# Altium footprint library My Library.PcbLib: 872 footprints (part 3 of 55)
Each footprint in its own frame and in the unit in brackets; x right, y up, seen from the top. Pads: shape width x height; smd on the part's side, far side on the other; paste and mask are expansions set on the pad; w line width, h text height; cw(c..) or ccw(c..) is an arc to the next point about the centre after c.
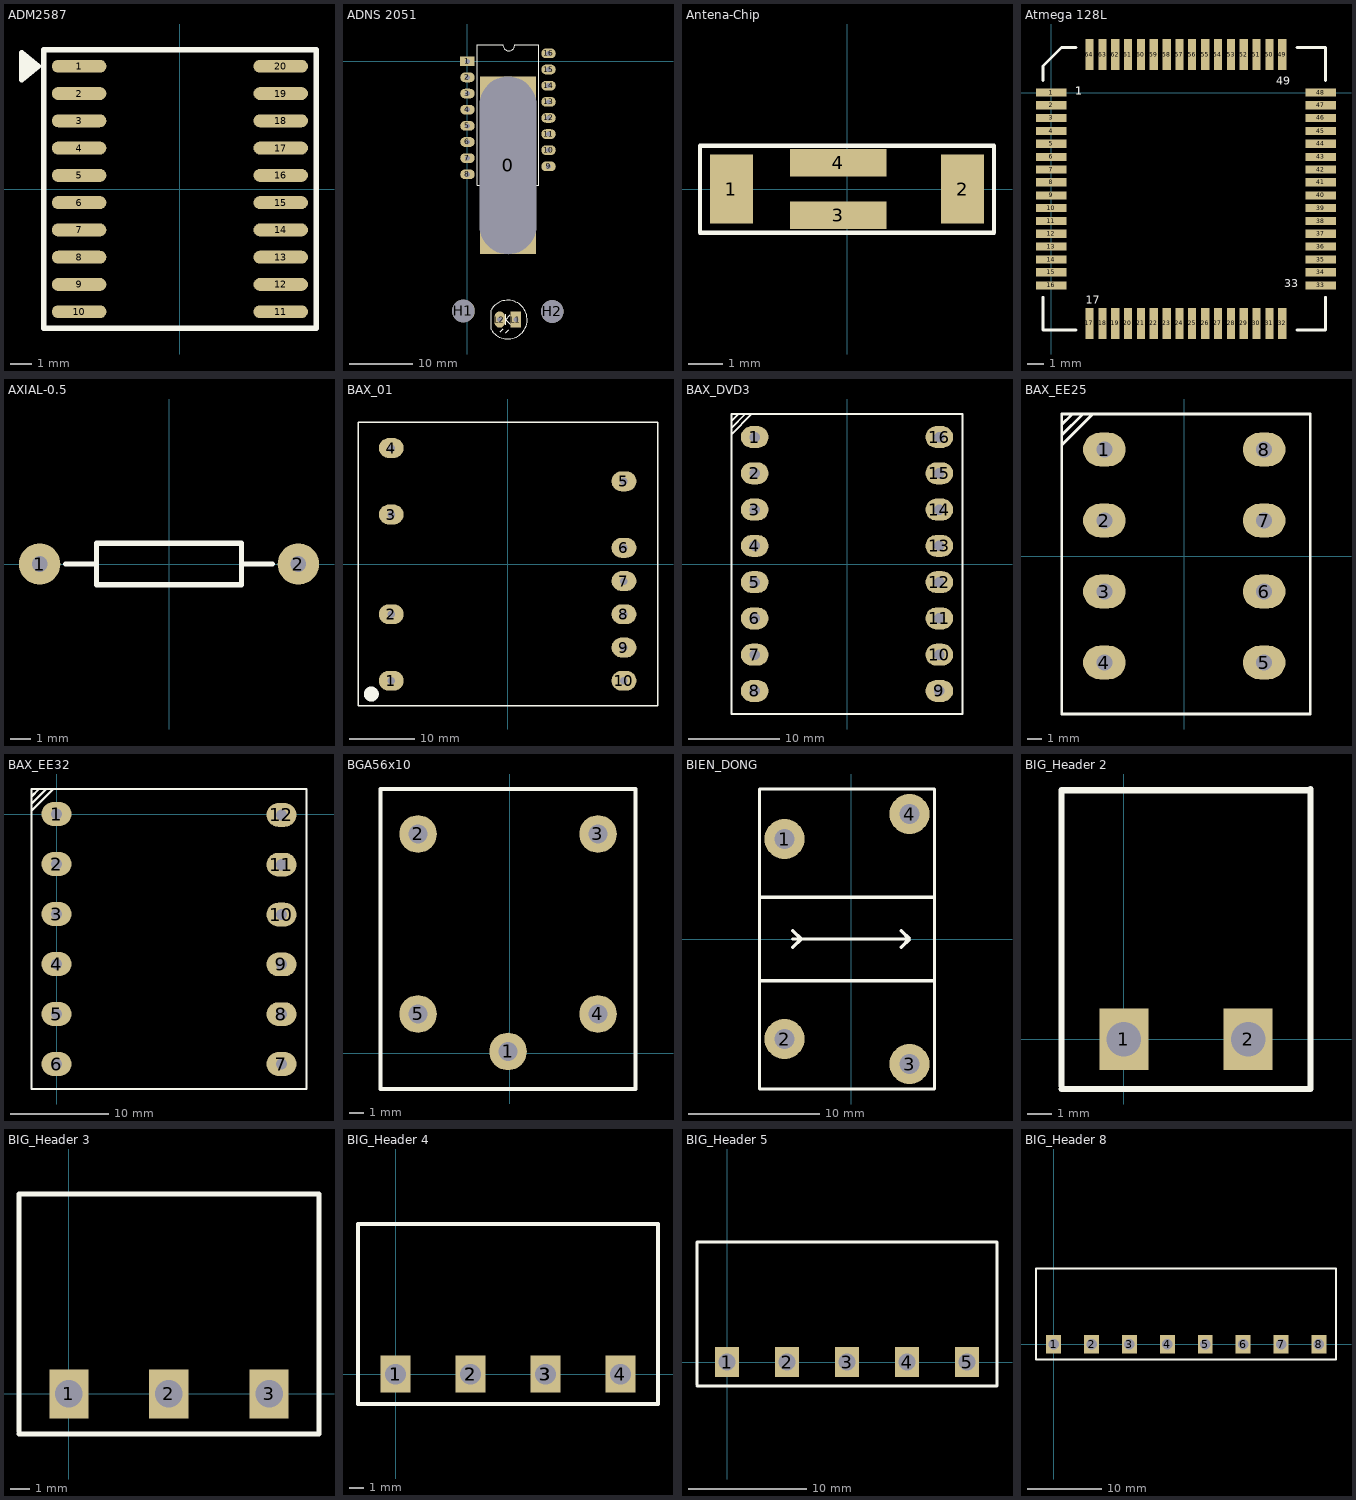
[diagram p2: the footprints below, top view; thin cyan lines are the x and y axes]

## ADM2587 [mm]
pads (20):
  oval 2.54x0.6 smd: 1(-4.695,5.715) 2(-4.695,4.445) 3(-4.695,3.175) 4(-4.695,1.905) 5(-4.695,0.635) 6(-4.695,-0.635) 7(-4.695,-1.905) 8(-4.695,-3.175) 9(-4.695,-4.445) 10(-4.695,-5.715) 11(4.695,-5.715) 12(4.695,-4.445) 13(4.695,-3.175) 14(4.695,-1.905) 15(4.695,-0.635) 16(4.695,0.635) 17(4.695,1.905) 18(4.695,3.175) 19(4.695,4.445) 20(4.695,5.715)
Top Overlay:
  region: -6.604,5.715 -7.366,6.35 -7.366,5.08
  lines w0.254: -7.366,5.08 -6.604,5.715 -7.366,6.35 -7.366,5.08 ; -6.35,-6.477 -6.35,6.477 6.35,6.477 6.35,-6.477 -6.35,-6.477
3D body: height 1.38, standoff 1.28, extent 3.658,-5.969 4.089,-5.461
3D body: height 1.38, standoff 0, extent 4.089,-5.969 4.191,-5.461
3D body: height 0.1, standoff 0, extent 4.191,-5.969 5.029,-5.461
3D body: height 0.1, standoff 0, extent 4.191,-4.699 5.029,-4.191
3D body: height 1.38, standoff 0, extent 4.089,-4.699 4.191,-4.191
3D body: height 1.38, standoff 1.28, extent 3.658,-4.699 4.089,-4.191
3D body: height 0.1, standoff 0, extent 4.191,-3.429 5.029,-2.921
3D body: height 1.38, standoff 0, extent 4.089,-3.429 4.191,-2.921
3D body: height 1.38, standoff 1.28, extent 3.658,-3.429 4.089,-2.921
3D body: height 0.1, standoff 0, extent 4.191,-2.159 5.029,-1.651
3D body: height 1.38, standoff 0, extent 4.089,-2.159 4.191,-1.651
3D body: height 1.38, standoff 1.28, extent 3.658,-2.159 4.089,-1.651
3D body: height 0.1, standoff 0, extent 4.191,-0.889 5.029,-0.381
3D body: height 1.38, standoff 0, extent 4.089,-0.889 4.191,-0.381
3D body: height 1.38, standoff 1.28, extent 3.658,-0.889 4.089,-0.381
3D body: height 0.1, standoff 0, extent 4.191,0.381 5.029,0.889
3D body: height 1.38, standoff 0, extent 4.089,0.381 4.191,0.889
3D body: height 1.38, standoff 1.28, extent 3.658,0.381 4.089,0.889
3D body: height 0.1, standoff 0, extent 4.191,1.651 5.029,2.159
3D body: height 1.38, standoff 0, extent 4.089,1.651 4.191,2.159
3D body: height 1.38, standoff 1.28, extent 3.658,1.651 4.089,2.159
3D body: height 0.1, standoff 0, extent 4.191,2.921 5.029,3.429
3D body: height 1.38, standoff 0, extent 4.089,2.921 4.191,3.429
3D body: height 1.38, standoff 1.28, extent 3.658,2.921 4.089,3.429
3D body: height 0.1, standoff 0, extent 4.191,4.191 5.029,4.699
3D body: height 1.38, standoff 0, extent 4.089,4.191 4.191,4.699
3D body: height 1.38, standoff 1.28, extent 3.658,4.191 4.089,4.699
3D body: height 0.1, standoff 0, extent 4.191,5.461 5.029,5.969
3D body: height 1.38, standoff 0, extent 4.089,5.461 4.191,5.969
3D body: height 1.38, standoff 1.28, extent 3.658,5.461 4.089,5.969
3D body: height 1.38, standoff 1.28, extent -4.115,-5.969 -3.683,-5.461
3D body: height 1.38, standoff 0, extent -4.216,-5.969 -4.115,-5.461
3D body: height 0.1, standoff 0, extent -5.055,-5.969 -4.216,-5.461
3D body: height 1.38, standoff 1.28, extent -4.115,-4.699 -3.683,-4.191
3D body: height 1.38, standoff 0, extent -4.216,-4.699 -4.115,-4.191
3D body: height 0.1, standoff 0, extent -5.055,-4.699 -4.216,-4.191
3D body: height 1.38, standoff 1.28, extent -4.115,-3.429 -3.683,-2.921
3D body: height 1.38, standoff 0, extent -4.216,-3.429 -4.115,-2.921
3D body: height 0.1, standoff 0, extent -5.055,-3.429 -4.216,-2.921
3D body: height 1.38, standoff 1.28, extent -4.115,-2.159 -3.683,-1.651
3D body: height 1.38, standoff 0, extent -4.216,-2.159 -4.115,-1.651
3D body: height 0.1, standoff 0, extent -5.055,-2.159 -4.216,-1.651
3D body: height 1.38, standoff 1.28, extent -4.115,-0.889 -3.683,-0.381
3D body: height 1.38, standoff 0, extent -4.216,-0.889 -4.115,-0.381
3D body: height 0.1, standoff 0, extent -5.055,-0.889 -4.216,-0.381
3D body: height 1.38, standoff 1.28, extent -4.115,0.381 -3.683,0.889
3D body: height 1.38, standoff 0, extent -4.216,0.381 -4.115,0.889
3D body: height 0.1, standoff 0, extent -5.055,0.381 -4.216,0.889
3D body: height 1.38, standoff 1.28, extent -4.115,1.651 -3.683,2.159
3D body: height 1.38, standoff 0, extent -4.216,1.651 -4.115,2.159
3D body: height 0.1, standoff 0, extent -5.055,1.651 -4.216,2.159
3D body: height 1.38, standoff 1.28, extent -4.115,2.921 -3.683,3.429
3D body: height 1.38, standoff 0, extent -4.216,2.921 -4.115,3.429
3D body: height 0.1, standoff 0, extent -5.055,2.921 -4.216,3.429
3D body: height 1.38, standoff 1.28, extent -4.115,4.191 -3.683,4.699
3D body: height 1.38, standoff 0, extent -4.216,4.191 -4.115,4.699
3D body: height 0.1, standoff 0, extent -5.055,4.191 -4.216,4.699
3D body: height 0.1, standoff 0, extent -5.055,5.461 -4.216,5.969
3D body: height 1.38, standoff 0, extent -4.216,5.461 -4.115,5.969
3D body: height 1.38, standoff 1.28, extent -4.115,5.461 -3.683,5.969
3D body: height 2.65, standoff 0.2, extent -3.8,-6.5 3.8,6.5
3D body: height 2.66, standoff 0, extent -3.359,5.041 -2.341,6.059

## ADNS 2051 [mil] "Foots pin for Mouse"
pads (21):
  rect 350x1100 hole 350 slot 1100 at 90 deg: 0(251,-645)
  rect 90x60 hole 31: 1(0,0)
  oval 90x60 hole 31: 2(0,-100) 3(0,-200) 4(0,-300) 5(0,-400) 6(0,-500) 7(0,-600) 8(0,-700) 9(502,-651) 10(502,-551) 11(502,-451) 12(502,-351) 13(502,-251) 14(502,-151) 15(502,-51) 16(502,49)
  round 140 hole 140: H1(-25,-1547) H2(525,-1550)
  rect 65x100 hole 32: L1(300,-1600.5)
  oval 65x100 hole 32: L2(200,-1600.5)
Top Overlay:
  lines w7: 146,-1660.5 146,-1541.5 ; 146.06,-1540.53 cw(c250,-1600.5) 146.49,-1661.21 ; 204,-1675.5 221,-1658.5 ; 218,103 59,103 59,-767 443,-767 443,103 296,103 ; 218.97,101 ccw(c255.99,101) 293,101 ; 236,-1632.5 236,-1566.5 ; 238,-1681.5 255,-1664.5 ; 265,-1629.5 236,-1600.5 265,-1571.5 ; 394.94,-516.95 ccw(c252.8,-525.96) 395,-518
  text "ADNS2051" at 108,-229 h40

## Antena-Chip [mil]
pads (4):
  rect 49.22x78.74 smd: 1(-131.89,0) 2(131.89,0)
  rect 110.24x31.5 smd: 3(-10,-30) 4(-10,30)
Top Overlay:
  lines w5: -167.85,-49.74 -167.85,49.21 167.85,49.21 167.85,-49.74 -167.85,-49.74
3D body: height 47.64, standoff 0, extent 157.99,-52.01 173.99,51.99
3D body: height 47.64, standoff 0, extent -174,-52 -158,52
3D body: height 47.24, standoff 1.97, extent -167.32,-49.21 167.32,49.21

## Atmega 128L [mil] "Atmega 128L, 64 pin SMT"
height 100
pads (64):
  rect 75x20 smd: 1(0,0) 2(0,-31) 3(0,-62) 4(0,-94) 5(0,-125) 6(0,-157) 7(0,-188) 8(0,-219) 9(0,-251) 10(0,-282) 11(0,-314) 12(0,-345) 13(0,-376) 14(0,-408) 15(0,-439) 16(0,-471) 33(658,-471) 34(658,-439) 35(658,-408) 36(658,-376) 37(658,-345) 38(658,-314) 39(658,-282) 40(658,-251) 41(658,-219) 42(658,-188) 43(658,-157) 44(658,-125) 45(658,-94) 46(658,-62) 47(658,-31) 48(658,0)
  rect 20x75 smd: 17(93,-564) 18(125,-564) 19(156,-564) 20(187,-564) 21(219,-564) 22(250,-564) 23(282,-564) 24(313,-564) 25(344,-564) 26(376,-564) 27(407,-564) 28(439,-564) 29(470,-564) 30(501,-564) 31(533,-564) 32(564,-564) 49(564,93) 50(533,93) 51(501,93) 52(470,93) 53(439,93) 54(407,93) 55(376,93) 56(344,93) 57(313,93) 58(282,93) 59(250,93) 60(219,93) 61(187,93) 62(156,93) 63(125,93) 64(93,93)
Top Overlay:
  lines w7: -20,-500 -20,-580 60,-580 ; -20,30 -20,65 25,110 60,110 ; 600,-580 670,-580 670,-500 ; 600,110 670,110 670,30
  text "1" at 59,-5.5 h20
  text "1" at 59,-5.5 h20
  text "49" at 549,19.5 h20
  text "17" at 84,-515.5 h20
  text "33" at 569,-475.5 h20

## AXIAL-0.5 [mil] "Resistor 500mil"
height 10
pads (2):
  round 80 hole 30: 1(-250,0) 2(250,0)
Top Overlay:
  lines w10: -200,0 -140,0 ; 140,0 200,0 ; -140,0 -140,-40 140,-40 140,40 -140,40 -140,0

## BAX_01 [mil] "Bien ap xung cho nguon T9AT"
pads (10):
  oval 150x120 hole 45: 1(-700,-700) 2(-700,-300) 3(-700,300) 4(-700,700) 5(700,500) 6(700,100) 7(700,-100) 8(700,-300) 9(700,-500) 10(700,-700)
Top Overlay:
  circle w50: c-820,-780 r20
  lines w8: -900,-850 905,-850 905,855 -900,855 -900,-850

## BAX_DVD3 [mil] "Bien ap xung DVD3"
pads (16):
  oval 120x95 hole 45: 1(-400,550) 2(-400,392.86) 3(-400,235.71) 4(-400,78.57) 5(-400,-78.57) 6(-400,-235.71) 7(-400,-392.86) 8(-400,-550) 9(400,-550) 10(400,-392.86) 11(400,-235.71) 12(400,-78.57) 13(400,78.57) 14(400,235.71) 15(400,392.86) 16(400,550)
Top Overlay:
  lines w8: -500,563 -414,649 ; -500,589 -500,591 -442,649 ; -500,618 -500,620 -471,649 ; -500,-650 -500,650 490,650 500,650 500,-650 -500,-650

## BAX_EE25 [mil] "EE25"
pads (8):
  oval 120x95 hole 45: 1(-225,300) 2(-225,100) 3(-225,-100) 4(-225,-300) 5(225,-300) 6(225,-100) 7(225,100) 8(225,300)
Top Overlay:
  lines w8: -345,313 -259,399 ; -345,339 -345,341 -287,399 ; -345,368 -345,370 -316,399 ; -345,-445 355,-445 355,400 -345,400 -345,-445

## BAX_EE32 [mil] "EE32"
pads (12):
  oval 120x95 hole 45: 1(0,0) 2(0,-200) 3(0,-400) 4(0,-600) 5(0,-800) 6(0,-1000) 7(900,-1000) 8(900,-800.71) 9(900,-601.43) 10(900,-402.14) 11(900,-202.86) 12(900,-3.57)
Top Overlay:
  lines w8: -100,13 -14,99 ; -100,39 -100,41 -42,99 ; -100,68 -100,70 -71,99 ; -100,-1100 -100,100 1000,100 1000,-1100 -100,-1100

## BGA56x10 [mil]
pads (5):
  round 100 hole 50: 1(-4,5) 2(-244,585) 3(236,585) 4(236,105) 5(-244,105)
Top Overlay:
  lines w10: -344,-95 -344,705 336,705 336,-95 -344,-95

## BIEN_DONG [mil]
pads (4):
  round 120 hole 60: 1(-200,300) 2(-200,-300) 3(175,-375) 4(175,375)
Top Overlay:
  lines w8: -275,-450 -275,425 -275,450 250,450 250,-450 -275,-450
  lines w10: -275,-125 250,-125 ; -275,125 250,125 ; -175,-25 -150,0 -175,25 ; -175,0 175,0 ; 150,-25 175,0 ; 150,25 175,0
3D body: height 896.45, standoff 0, extent -275,-450 250,448.22
3D body: height 450, standoff 0, extent -275,-450 250,448.22

## BIG_Header 2 [mm]
pads (2):
  rect 2x2.5 hole 1.4: 1(0,0) 2(5.08,0)
Top Overlay:
  lines w0.254: -2.54,-2.032 7.62,-2.032 7.62,10.211 ; -2.54,-1.905 -2.54,10.173 ; -2.54,10.16 7.62,10.16
3D body "User Library-BigHeader 5EHDR_1P.step": height 3.15, standoff -9.32, extent 2.58,-1.75 7.58,10.25
3D body "User Library-BigHeader 5EHDR_1P.step": height 3.15, standoff -9.32, extent -2.5,-1.75 2.5,10.25

## BIG_Header 3 [mm]
pads (3):
  rect 2x2.5 hole 1.4: 1(0,0) 2(5.08,0) 3(10.173,0)
Top Overlay:
  lines w0.254: -2.54,-2.032 12.713,-2.032 12.713,10.16 -2.54,10.16 -2.54,-1.905
3D body "User Library-BigHeader 5EHDR_1P.step": height 3.15, standoff -9.32, extent -2.5,-1.75 2.5,10.25
3D body "User Library-BigHeader 5EHDR_1P.step": height 3.15, standoff -9.32, extent 2.593,-1.75 7.593,10.25
3D body "User Library-BigHeader 5EHDR_1P.step": height 3.15, standoff -9.32, extent 7.673,-1.75 12.673,10.25

## BIG_Header 4 [mm]
pads (7):
  rect 2x2.5 hole 1.4: 1(0,0) 1(0,0) 2(5.08,0) 2(5.08,0) 3(10.16,0) 3(10.173,0) 4(15.24,0)
Top Overlay:
  lines w0.254: 12.713,-2.032 -2.54,-2.032 7.62,-2.032 17.78,-2.032 17.78,10.173 -2.527,10.173 -2.54,10.173 -2.54,-1.905 -2.54,10.16 ; 12.713,10.16 -2.54,10.16 ; 17.78,10.16 -2.54,10.16
3D body "User Library-BigHeader 5EHDR_1P.step": height 3.15, standoff -9.32, extent -2.5,-1.75 2.5,10.25
3D body "User Library-BigHeader 5EHDR_1P.step": height 3.15, standoff -9.32, extent 2.58,-1.75 7.58,10.25
3D body "User Library-BigHeader 5EHDR_1P.step": height 3.15, standoff -9.32, extent 7.66,-1.75 12.66,10.25
3D body "User Library-BigHeader 5EHDR_1P.step": height 3.15, standoff -9.32, extent 12.74,-1.75 17.74,10.25

## BIG_Header 5 [mm]
pads (5):
  rect 2x2.5 hole 1.4: 1(0,0) 2(5.08,0) 3(10.16,0) 4(15.24,0) 5(20.32,0)
Top Overlay:
  lines w0.254: -2.54,-2.032 7.62,-2.032 22.86,-2.032 22.86,10.16 ; -2.54,-1.905 -2.54,10.16 ; -2.54,10.16 6.248,10.16 22.86,10.16 ; -2.54,10.16 22.86,10.16
3D body "User Library-BigHeader 5EHDR_1P.step": height 3.15, standoff -9.32, extent 17.82,-1.75 22.82,10.25
3D body "User Library-BigHeader 5EHDR_1P.step": height 3.15, standoff -9.32, extent 12.74,-1.75 17.74,10.25
3D body "User Library-BigHeader 5EHDR_1P.step": height 3.15, standoff -9.32, extent 7.66,-1.75 12.66,10.25
3D body "User Library-BigHeader 5EHDR_1P.step": height 3.15, standoff -9.32, extent 2.58,-1.75 7.58,10.25
3D body "User Library-BigHeader 5EHDR_1P.step": height 3.15, standoff -9.32, extent -2.5,-1.75 2.5,10.25

## BIG_Header 8 [mm]
pads (8):
  rect 2x2.5 hole 1.4: 1(0,0) 2(5.08,0) 3(10.16,0) 4(15.24,0) 5(20.32,0) 6(25.4,0) 7(30.48,0) 8(35.56,0)
Top Overlay:
  lines w0.254: 13.843,10.16 37.846,10.16 37.846,-2.032 27.94,-2.032 17.78,-2.032 7.62,-2.032 -2.362,-2.032 -2.362,10.16 17.78,10.16
3D body "User Library-BigHeader 5EHDR_1P.step": height 3.15, standoff -9.32, extent 33.06,-1.75 38.06,10.25
3D body "User Library-BigHeader 5EHDR_1P.step": height 3.15, standoff -9.32, extent 27.98,-1.75 32.98,10.25
3D body "User Library-BigHeader 5EHDR_1P.step": height 3.15, standoff -9.32, extent 22.9,-1.75 27.9,10.25
3D body "User Library-BigHeader 5EHDR_1P.step": height 3.15, standoff -9.32, extent 17.82,-1.75 22.82,10.25
3D body "User Library-BigHeader 5EHDR_1P.step": height 3.15, standoff -9.32, extent 12.74,-1.75 17.74,10.25
3D body "User Library-BigHeader 5EHDR_1P.step": height 3.15, standoff -9.32, extent 7.66,-1.75 12.66,10.25
3D body "User Library-BigHeader 5EHDR_1P.step": height 3.15, standoff -9.32, extent 2.58,-1.75 7.58,10.25
3D body "User Library-BigHeader 5EHDR_1P.step": height 3.15, standoff -9.32, extent -2.5,-1.75 2.5,10.25